# Altium footprint library ParsaLibrary.PcbLib: 526 footprints (part 17 of 33)
Each footprint in its own frame and in the unit in brackets; x right, y up, seen from the top. Pads: shape width x height; smd on the part's side, far side on the other; paste and mask are expansions set on the pad; w line width, h text height; cw(c..) or ccw(c..) is an arc to the next point about the centre after c.
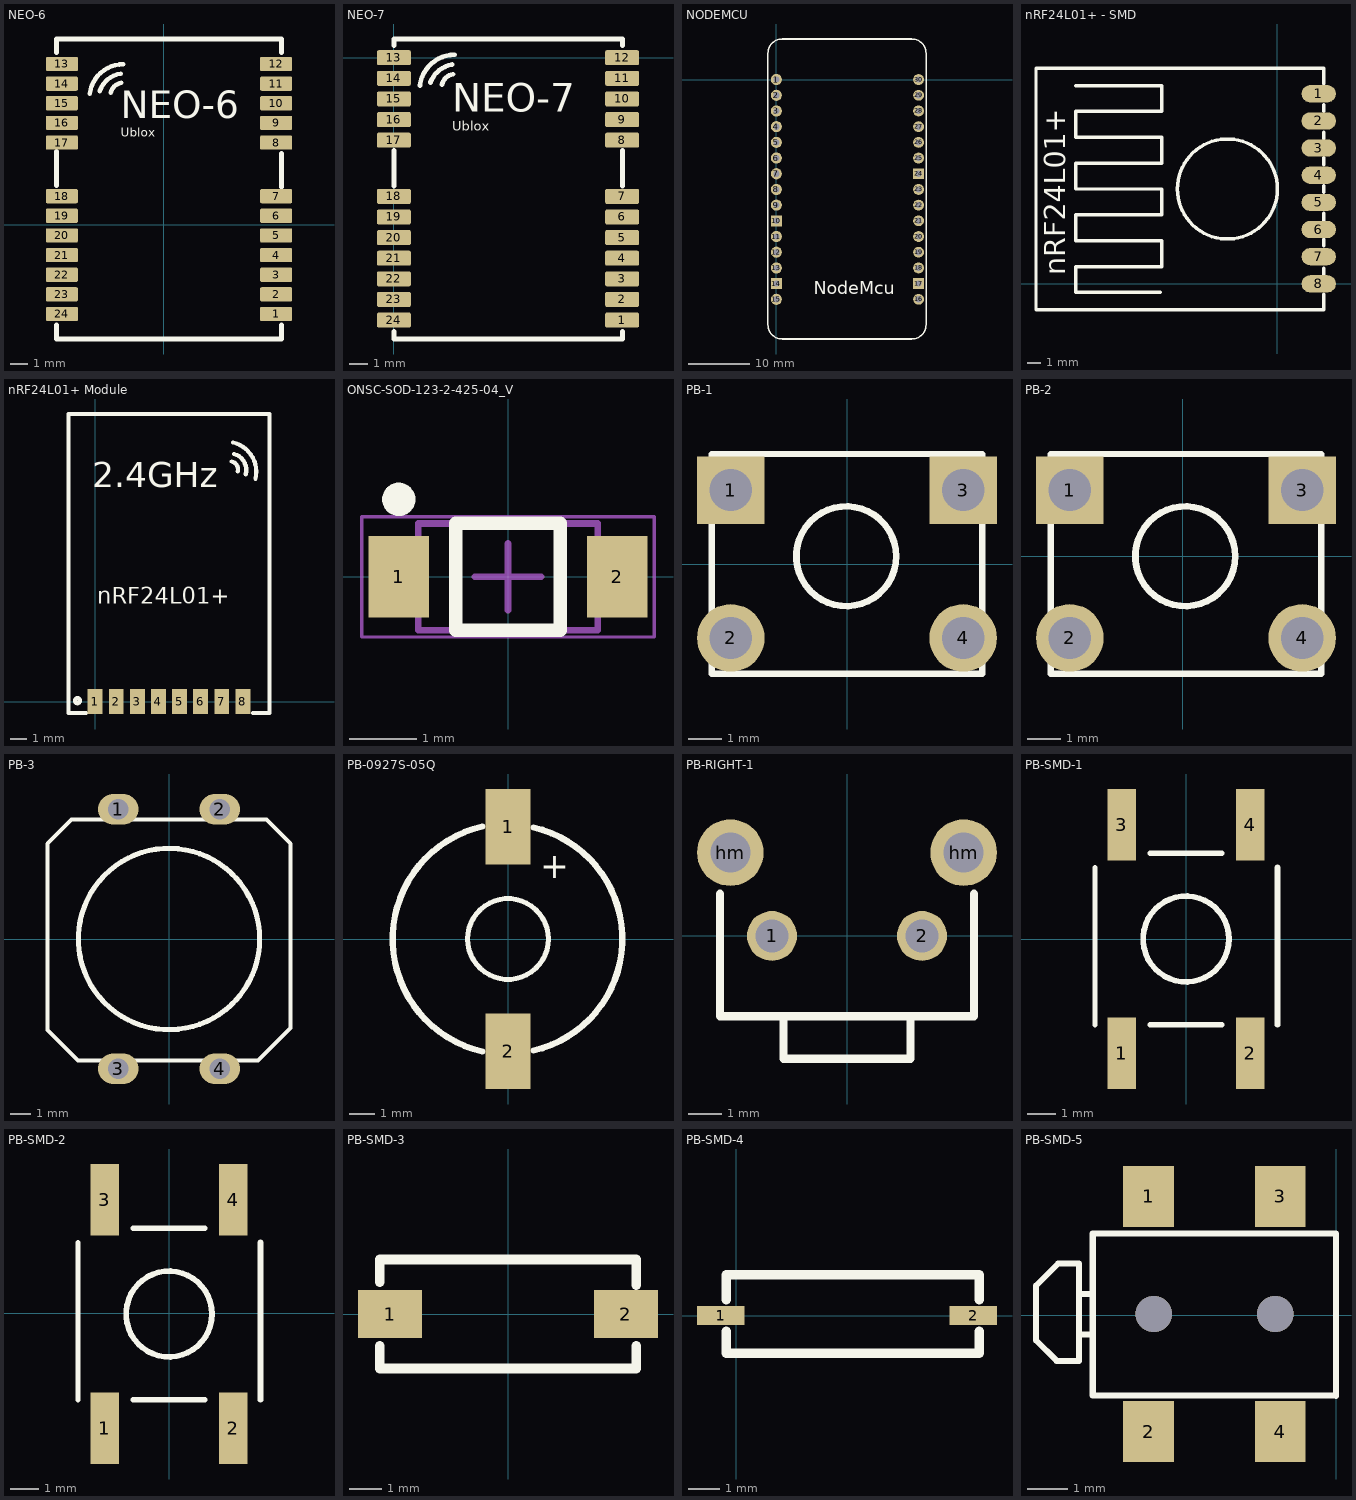
[diagram p16: the footprints below, top view; thin cyan lines are the x and y axes]

## NEO-6 [mm]
pads (24):
  rrect20% 1.8x0.8 smd: 1(6.3,-5) 2(6.3,-3.9) 3(6.3,-2.8) 4(6.3,-1.7) 5(6.3,-0.6) 6(6.3,0.5) 7(6.3,1.6) 8(6.3,4.6) 9(6.3,5.7) 10(6.3,6.8) 11(6.3,7.9) 12(6.3,9) 13(-5.7,9) 14(-5.7,7.9) 15(-5.7,6.8) 16(-5.7,5.7) 17(-5.7,4.6) 18(-5.7,1.6) 19(-5.7,0.5) 20(-5.7,-0.6) 21(-5.7,-1.7) 22(-5.7,-2.8) 23(-5.7,-3.9) 24(-5.7,-5)
Top Overlay:
  lines w0.254: -6,-5.605 -6,-6.4 6.6,-6.4 6.6,-5.605 ; -6,2.195 -6,4.1 ; -6,9.635 -6,10.4 6.6,10.4 6.6,9.635 ; -4.135,7.344 cw(c-2.271,7.107) -2.271,8.986 ; -3.573,7.487 cw(c-2.204,7.028) -2.412,8.458 ; -2.958,7.383 cw(c-2.273,7.249) -2.372,7.94 ; 6.6,2.095 6.6,4
  text "Ublox" at -2.398,4.936 h0.5
  text "NEO-6" at -2.398,5.952 h1.52
3D body "User Library-UBLOX_GPS_NEO-6M.step": height 2.64, standoff 0, extent -5.88,-6.3 6.48,10.3

## NEO-7 [mm]
pads (24):
  rrect20% 1.8x0.8 smd: 1(12.178,-14) 2(12.178,-12.9) 3(12.178,-11.8) 4(12.178,-10.7) 5(12.178,-9.6) 6(12.178,-8.5) 7(12.178,-7.4) 8(12.178,-4.4) 9(12.178,-3.3) 10(12.178,-2.2) 11(12.178,-1.1) 12(12.178,0) 13(0,0) 14(0,-1.1) 15(0,-2.2) 16(0,-3.3) 17(0,-4.4) 18(0,-7.4) 19(0,-8.5) 20(0,-9.6) 21(0,-10.7) 22(0,-11.8) 23(0,-12.9) 24(0,-14)
Top Overlay:
  lines w0.254: 0,-14.605 0,-15.011 12.2,-15.011 12.2,-14.605 ; 0,-6.858 0,-4.953 ; 0,0.635 0,1 12.2,1 12.2,0.635 ; 1.387,-1.478 cw(c3.251,-1.715) 3.251,0.164 ; 1.949,-1.335 cw(c3.319,-1.794) 3.111,-0.364 ; 2.564,-1.439 cw(c3.249,-1.574) 3.15,-0.882 ; 12.2,-6.858 12.2,-4.953
  text "NEO-7" at 3.124,-2.87 h1.52
  text "Ublox" at 3.124,-3.886 h0.5
3D body "User Library-neo-m8n.step": height 2.4, standoff 0, extent 0,-15 12.2,1

## NODEMCU [mm]
pads (30):
  round 1.8 hole 1: 1(0,0) 2(0,-2.54) 3(0,-5.08) 4(0,-7.62) 5(0,-10.16) 6(0,-12.7) 7(0,-15.24) 8(0,-17.78) 9(0,-20.32) 11(0,-25.4) 12(0,-27.94) 13(0,-30.48) 15(0,-35.56)
  rect 1.8x1.8 hole 1: 10(0,-22.86) 14(0,-33.02)
  round 1.753 hole 1: 16(23.012,-35.56) 18(23.012,-30.48) 19(23.012,-27.94) 20(23.012,-25.4) 21(23.012,-22.86) 22(23.012,-20.32) 23(23.012,-17.78) 25(23.012,-12.7) 26(23.012,-10.16) 27(23.012,-7.62) 28(23.012,-5.08) 29(23.012,-2.54) 30(23.012,0)
  rect 1.753x1.753 hole 1: 17(23.012,-33.02) 24(23.012,-15.24)
Top Overlay:
  lines w0.254: -1.36,-39.698 ccw(c0.926,-39.698) 0.926,-41.984 21.94,-41.984 ccw(c21.94,-39.698) 24.226,-39.698 24.226,4.281 ccw(c21.94,4.281) 21.94,6.567 0.926,6.567 ccw(c0.926,4.281) -1.36,4.281 -1.36,-39.698
  text "NodeMcu" at 6.04,-35.484 h3.56
3D body "User Library-NODEMCU_DEVKIT_V1_0.STEP": height 6.27, standoff -5.92, extent -1.371,-42.556 24.409,6.437

## nRF24L01+ - SMD [mil]
pads (8):
  oval 100x50 smd: 1(120,551.18) 2(120,472.44) 3(120,393.7) 4(120,314.96) 5(120,236.22) 6(120,157.48) 7(120,78.74) 8(120,0)
Top Overlay:
  circle w10: c-145,275 r145
  lines w10: -585,575 -335,575 -335,500 -585,500 -585,425 -335,425 -335,350 -585,350 -585,275 -335,275 -335,200 -585,200 -585,125 -335,125 -335,50 -585,50 -585,-25 -340,-25 ; 135,-30 135,-75 125,-75 -700,-75 -700,625 135,625 135,580 ; 135,25 135,45 ; 135,110 135,130 ; 135,185 135,205 ; 135,265 135,285 ; 135,345 135,365 ; 135,420 135,440 ; 135,500 135,520
  text "nRF24L01+" at -615,25 h60

## nRF24L01+ Module [mm] "nRF24L01+ Module"
pads (8):
  rect 0.9x1.5 smd: 1(0,0) 2(1.27,0) 3(2.54,0) 4(3.81,0) 5(5.08,0) 6(6.35,0) 7(7.62,0) 8(8.89,0)
Top Overlay:
  circle w0.254: c-1.067,0.051 r0.148
  lines w0.254: -0.559,-0.686 -1.6,-0.686 -1.6,17.314 10.49,17.314 10.49,-0.686 9.5,-0.686 ; 8.23,14.453 cw(c8.115,13.983) 8.585,13.868 ; 8.306,15.596 cw(c7.887,13.83) 9.652,13.411 ; 8.357,14.91 cw(c8.103,13.945) 9.068,13.691
  text "2.4GHz" at -0.178,12.903 h1.52
  text "nRF24L01+" at 0.127,5.893 h1

## ONSC-SOD-123-2-425-04_V [mm] "SOD, 2-Leads, Body 2.69x1.6mm"
height 1.35
pads (2):
  rect 0.91x1.22 smd: 1(-1.635,0) 2(1.635,0)
Top Overlay:
  circle w0.25: c-1.635,1.16 r0.125
  lines w0.2: -0.78,-0.8 0.78,-0.8 0.78,0.8 -0.78,0.8 -0.78,-0.8
Top 3D Body:
  lines w0.1: -1.345,-0.8 1.345,-0.8 1.345,0.8 -1.345,0.8 -1.345,-0.8
Top Courtyard:
  lines w0.05: -2.19,-0.9 2.19,-0.9 2.19,0.9 -2.19,0.9 -2.19,-0.9
  lines w0.1: -0.5,0 0.5,0 ; 0,-0.5 0,0.5
3D body "MBR0520LT3G.stp": height 1.35, standoff 0, extent -1.85,-0.795 1.86,0.805

## PB-1 [mil] "SHORT PUSH BUTTON"
pads (4):
  rect 80x80 hole 50: 1(-137.5,87.5) 3(137.5,87.5)
  round 80 hole 50: 2(-137.5,-87.5) 4(137.5,-87.5)
Top Overlay:
  circle w7.87: c-0.89,9.15 r59.06
  lines w7: -160,130 160,130
  lines w7.87: -160,130 -160,-130 160,-130 160,130
3D body "tactileswitch-short.STEP": height 215, standoff -113, extent -150.4,-117.29 152.4,119.21

## PB-2 [mil]
pads (4):
  rect 80x80 hole 50: 1(-133.5,78.5) 3(141.5,78.5)
  round 80 hole 50: 2(-133.5,-96.5) 4(141.5,-96.5)
Top Overlay:
  circle w7.87: c3.11,0.15 r59.06
  lines w7: -156,121 164,121
  lines w7.87: -156,121 -156,-139 164,-139 164,121
3D body "tactileswitch-long.STEP": height 536, standoff -113, extent -146.4,-126.29 156.4,110.2

## PB-3 [mm] "12mmx12mm"
height 10
pads (4):
  oval 2x1.5 hole 1: 1(-2.5,6.4) 2(2.5,6.4) 3(-2.5,-6.4) 4(2.5,-6.4)
Top Overlay:
  circle w0.254: c0,0 r4.472
  lines w0.2: -6,-4.5 -4.5,-6 4.4,-6 6,-4.4 6,4.7 4.8,5.9 -4.8,5.9 -6,4.7 -6,-4.5
3D body "Push.STEP": height 11.1, standoff -4.32, extent -5.985,-6.814 6.015,6.822

## PB-0927S-05Q [mm] "magnetic Buzzer"
pads (2):
  rect 1.8x3 smd: 1(0,4.445) 2(0,-4.445)
Top Overlay:
  circle w0.2: c0,0 r1.6
  lines w0.254: -1.019,-4.457 cw(c0,0) -1.019,4.457 ; 1.01,-4.419 ccw(c0,0) 1.01,4.419
  text "+" at 1.27,2.413 h1
3D body: height 5, standoff 0, extent -4.5,-4.499 4.5,4.499

## PB-RIGHT-1 [mm]
pads (4):
  round 1.5 hole 1 paste-2539.97: 1(-2.25,0)
  round 1.5 hole 1: 2(2.25,0)
  round 2 hole 1.2: hm(-3.5,2.5) hm(3.5,2.5)
Top Overlay:
  lines w0.254: -3.81,1.27 -3.81,-2.413 3.81,-2.413 3.81,1.27 ; -1.905,-2.413 -1.905,-3.683 1.905,-3.683 1.905,-2.413
3D body "User Library-SWITCH, TACTILE, RIGHT ANGLE, 12VDC, 50MA, 8_35MM ACTUATOR, WEALTH METAL TC-0240Z.step": height 7, standoff -4, extent -3.7,-8.45 3.7,4.05

## PB-SMD-1 [mm]
pads (4):
  rect 1x2.5 smd: 1(-2.25,-3.992) 2(2.25,-3.992) 3(-2.25,3.992) 4(2.25,3.992)
Top Overlay:
  circle w0.2: c0,0 r1.5
  lines w0.178: -3.175,-2.997 -3.175,2.503
  lines w0.2: -1.25,-3 1.25,-3 ; -1.25,3 1.25,3 ; 3.2,-2.997 3.2,2.503
3D body "SW3dPS-switch.STEP": height 5, standoff 0, extent -3,-4.5 3,4.5

## PB-SMD-2 [mm]
pads (4):
  rect 1x2.5 smd: 1(-2.25,-4.018) 2(2.25,-4.018) 3(-2.25,3.967) 4(2.25,3.967)
Top Overlay:
  circle w0.2: c0,-0.025 r1.5
  lines w0.178: -3.175,-3.023 -3.175,2.477
  lines w0.2: -1.25,-3.025 1.25,-3.025 ; -1.25,2.975 1.25,2.975 ; 3.2,-3.023 3.2,2.477
3D body "1.STEP": height 4.23, standoff 0, extent -3.54,-4.555 3.54,4.445

## PB-SMD-3 [mm]
pads (2):
  rect 2x1.5 smd: 1(-3.683,0) 2(3.683,0)
Top Overlay:
  lines w0.3: -4,-1 -4,-1.7 4,-1.7 4,-1 ; -4,1 -4,1.7 4,1.7 4,0.9
3D body "Pulsador.stp": height 4.3, standoff 0, extent -4,-1.75 4,1.75

## PB-SMD-4 [mm]
pads (2):
  rect 1.5x0.6 smd: 1(-0.5,0) 2(7.5,0)
Top Overlay:
  lines w0.3: -0.317,-0.5 -0.317,-1.2 7.683,-1.2 7.683,-0.5 ; -0.317,0.5 -0.317,1.3 7.683,1.3 7.683,0.5

## PB-SMD-5 [mm] "12mmx12mm"
height 10
pads (4):
  rect 1.25x1.5 smd: 1(-4.625,2.925) 2(-4.625,-2.875) 3(-1.375,2.925) 4(-1.375,-2.875)
via -4.5,0.025 diameter 0.9 hole 0.9
via -1.5,0.025 diameter 0.9 hole 0.9
Top Overlay:
  lines w0.15: -6.335,-0.478 -5.997,-0.478 ; -6.335,0.518 -6.026,0.518 ; 0,-2 0,2 ; 0,-1.989 -6,-1.989 -6,2.011 0,2.011 ; -7.4,-0.623 -6.891,-1.132 -6.343,-1.132 -6.343,1.268 -6.857,1.268 -7.4,0.725 -7.4,-0.623